# Altium footprint library mylib.PcbLib: 82 footprints (part 4 of 6)
Each footprint in its own frame and in the unit in brackets; x right, y up, seen from the top. Pads: shape width x height; smd on the part's side, far side on the other; paste and mask are expansions set on the pad; w line width, h text height; cw(c..) or ccw(c..) is an arc to the next point about the centre after c.
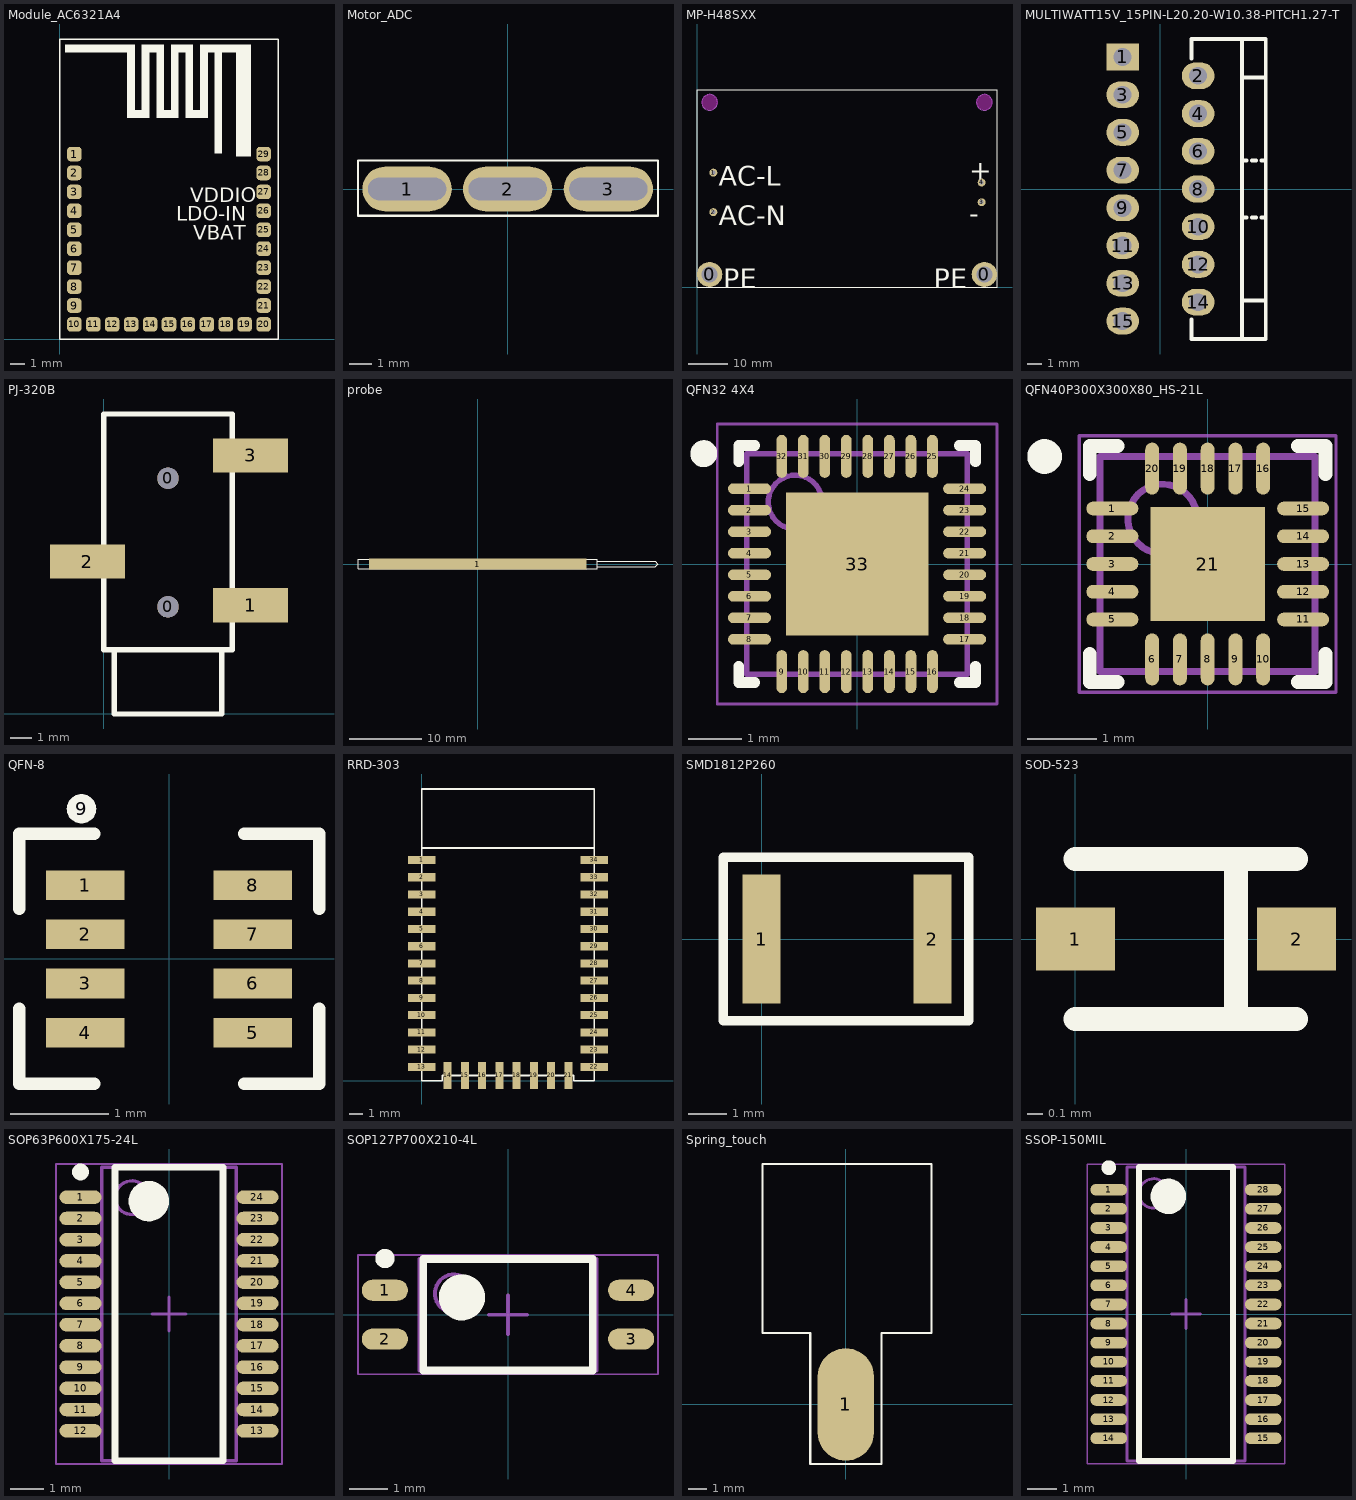
[diagram p3: the footprints below, top view; thin cyan lines are the x and y axes]

## Module_AC6321A4 [mm]
pads (29):
  rrect50% 1x1 smd: 1(1,12.7) 2(1,11.4) 3(1,10.1) 4(1,8.8) 5(1,7.5) 6(1,6.2) 7(1,4.9) 8(1,3.6) 9(1,2.3) 10(1,1) 11(2.3,1) 12(3.6,1) 13(4.9,1) 14(6.2,1) 15(7.5,1) 16(8.8,1) 17(10.1,1) 18(11.4,1) 19(12.7,1) 20(14,1) 21(14,2.3) 22(14,3.6) 23(14,4.9) 24(14,6.2) 25(14,7.5) 26(14,8.8) 27(14,10.1) 28(14,11.4) 29(14,12.7)
Top Overlay:
  region: 6.145,15.7 4.645,15.7 4.645,15.2 6.145,15.2
  region: 9.145,20.2 7.645,20.2 7.645,19.7 9.145,19.7
  region: 5.145,20.2 4.645,20.2 4.645,15.2 5.145,15.2
  region: 5.145,20.2 0.375,20.2 0.375,19.7 5.145,19.7
  region: 13.125,19.95 12.125,19.95 12.125,12.559 13.125,12.559
  region: 11.125,19.95 10.625,19.95 10.625,12.75 11.125,12.75
  region: 10.145,20.2 9.645,20.2 9.645,15.2 10.145,15.2
  region: 13.125,20.2 9.645,20.2 9.645,19.7 13.125,19.7
  region: 9.145,20.2 8.645,20.2 8.645,15.2 9.145,15.2
  region: 10.145,15.7 8.645,15.7 8.645,15.2 10.145,15.2
  region: 6.145,20.2 5.645,20.2 5.645,15.2 6.145,15.2
  region: 8.145,15.7 6.645,15.7 6.645,15.2 8.145,15.2
  region: 8.145,20.2 7.645,20.2 7.645,15.2 8.145,15.2
  region: 7.145,20.2 6.645,20.2 6.645,15.2 7.145,15.2
  region: 7.145,20.2 5.645,20.2 5.645,19.7 7.145,19.7
  lines w0.1: 0,0 15,0 15,20.6 0,20.6 0,0
  text "LDO-IN" at 8,8.113 h1
  text "VDDIO" at 8.952,9.406 h1
  text "VBAT" at 9.152,6.819 h1
3D body: height 1, standoff 0, extent -0.011,0 15,20.625
3D body: height 2, standoff 1, extent 1,1 14,12.7

## Motor_ADC [mm]
pads (3):
  oval 4x2 hole 1 slot 3.5 at 0 deg: 1(-4.5,0) 2(0,0) 3(4.5,0)
Top Overlay:
  lines w0.1: -6.7,-1.2 6.725,-1.2 6.725,1.275 -6.7,1.275 -6.7,-1.2

## MP-H48SXX [mm]
pads (6):
  round 6.4 hole 4: 0(3.2,3.2) 0(72.8,3.2)
  round 2 hole 1: 1(4.15,29) 2(4.15,19) 3(72.1,21.5) 4(72.1,26.5)
Top Overlay:
  lines w0.1: 0,0 76,0 76,50 0,50 0,0
  text "AC-N" at 5.45,15.65 h5
  text "AC-L" at 5.45,25.65 h5
  text "-" at 69,16.125 h5
  text "+" at 68.95,27.125 h5
  text "PE" at 6.65,-0.3 h5
  text "PE" at 60.025,-0.3 h5
Keep-Out Layer:
  board cut-out: 3.2,44.8 3.003,44.8 2.617,44.877 2.253,45.028 1.925,45.246 1.646,45.525 1.428,45.853 1.277,46.217 1.2,46.603 1.2,46.8 1.2,46.997 1.277,47.383 1.428,47.747 1.646,48.075 1.925,48.354 2.253,48.572 2.617,48.723 3.003,48.8 3.2,48.8 3.397,48.8 3.783,48.723 4.147,48.572 4.475,48.354 4.754,48.075 4.972,47.747 5.123,47.383 5.2,46.997 5.2,46.8 5.2,46.603 5.123,46.217 4.972,45.853 4.754,45.525 4.475,45.246 4.147,45.028 3.783,44.877 3.397,44.8
  board cut-out: 70.8,46.8 70.8,46.603 70.877,46.217 71.028,45.853 71.246,45.525 71.525,45.246 71.853,45.028 72.217,44.877 72.603,44.8 72.8,44.8 72.997,44.8 73.383,44.877 73.747,45.028 74.075,45.246 74.354,45.525 74.572,45.853 74.723,46.217 74.8,46.603 74.8,46.8 74.8,46.997 74.723,47.383 74.572,47.747 74.354,48.075 74.075,48.354 73.747,48.572 73.383,48.723 72.997,48.8 72.8,48.8 72.603,48.8 72.217,48.723 71.853,48.572 71.525,48.354 71.246,48.075 71.028,47.747 70.877,47.383 70.8,46.997
Mechanical 1:
  circle w0.1: c72.8,46.8 r2
  circle w0.1: c3.2,46.8 r2
3D body: height 5, standoff 0, extent 0,43.6 6.4,50
3D body: height 5, standoff 0, extent 69.6,43.625 76,50.025
3D body: height 5, standoff 0, extent 69.6,0 76,6.4
3D body: height 5, standoff 0, extent 0.038,0 6.438,6.4
3D body: height 5, standoff 0, extent 71.138,20.5 73.138,22.5
3D body: height 5, standoff 0, extent 71.138,25.5 73.138,27.5
3D body: height 5, standoff 0, extent 3.187,18 5.188,20
3D body: height 5, standoff 0, extent 3.187,28 5.188,30
3D body: height 13.3, standoff 5, extent 0,0 76,50

## MULTIWATT15V_15PIN-L20.20-W10.38-PITCH1.27-T [mm]
pads (15):
  rect 2.2x1.8 hole 1.2: 1(-2.54,8.89)
  oval 2.2x1.8 hole 1.2: 2(2.54,7.62) 3(-2.54,6.35) 4(2.54,5.08) 5(-2.54,3.81) 6(2.54,2.54) 7(-2.54,1.27) 8(2.54,0) 9(-2.54,-1.27) 10(2.54,-2.54) 11(-2.54,-3.81) 12(2.54,-5.08) 13(-2.54,-6.35) 14(2.54,-7.62) 15(-2.54,-8.89)
Top Overlay:
  lines w0.254: 2.09,-8.786 2.09,-10.1 7.09,-10.1 7.09,10.1 2.09,10.1 2.09,8.786 ; 5.49,-10.1 5.49,10.1 ; 5.49,-7.5 7.09,-7.5 ; 5.49,-1.925 5.79,-1.925 ; 5.49,1.925 5.79,1.925 ; 5.49,7.5 7.09,7.5 ; 6.15,-1.925 6.45,-1.925 ; 6.15,1.925 6.45,1.925 ; 6.79,-1.925 7.09,-1.925 ; 6.79,1.925 7.09,1.925

## PJ-320B [mm]
pads (5):
  round 1 hole 1: 0(3,5) 0(3,11)
  rect 3.5x1.6 smd: 1(6.858,5.08) 2(-0.762,7.112) 3(6.858,12.065)
Top Overlay:
  lines w0.254: 0.5,2.992 0.5,0 5.5,0 5.5,2.961 ; 0,3 0,14 6,14 6,3 0,3

## probe [mm] "探针"
pads (1):
  rect 30x1.524 smd: 1(0,0)
Top Overlay:
  lines w0.152: 16.51,-0.381 24.51,-0.381 ; 16.51,0.381 24.51,0.381 ; 24.511,-0.381 24.892,0 24.511,0.381 ; -16.51,-0.635 -16.51,0.635 16.49,0.635 16.49,-0.635 -16.51,-0.635

## QFN32 4X4 [mm] "JieLi 32-bit MCU, QFN32"
pads (33):
  oval 0.8x0.2 smd mask+0.05: 1(-2,1.4) 2(-2,1) 3(-2,0.6) 4(-2,0.2) 5(-2,-0.2) 6(-2,-0.6) 7(-2,-1) 8(-2,-1.4) 17(2,-1.4) 18(2,-1) 19(2,-0.6) 20(2,-0.2) 21(2,0.2) 22(2,0.6) 23(2,1) 24(2,1.4)
  oval 0.2x0.8 smd mask+0.05: 9(-1.4,-2) 10(-1,-2) 11(-0.6,-2) 12(-0.2,-2) 13(0.2,-2) 14(0.6,-2) 15(1,-2) 16(1.4,-2) 25(1.4,2) 26(1,2) 27(0.6,2) 28(0.2,2) 29(-0.2,2) 30(-0.6,2) 31(-1,2) 32(-1.4,2)
  rect 2.65x2.65 smd mask+0.05: 33(0,0)
Top Overlay:
  circle w0.25: c-2.85,2.05 r0.125
  lines w0.2: -2.2,-1.9 -2.2,-2.2 -1.9,-2.2 ; -2.2,1.9 -2.2,2.2 -1.9,2.2 ; 1.9,-2.2 2.2,-2.2 2.2,-1.9 ; 1.9,2.2 2.2,2.2 2.2,1.9
Mechanical 13:
  circle w0.1: c-1.15,1.15 r0.5
  lines w0.1: -2.05,-2.05 2.05,-2.05 2.05,2.05 -2.05,2.05 -2.05,-2.05
Mechanical 15:
  lines w0.05: -2.6,-2.6 2.6,-2.6 2.6,2.6 -2.6,2.6 -2.6,-2.6
3D body "QFN40P400X400X80_HS-33N.step": height 0.8, standoff 0, extent -2.051,-2.051 2.051,2.051

## QFN40P300X300X80_HS-21L [mm] "QFN, 20-Leads, Body 3.00x3.00mm, Pitch 0.40mm, Thermal Pad 1.65x1.65mm, IPC High Density"
height 0.8
pads (21):
  oval 0.75x0.2 smd: 1(-1.375,0.8) 2(-1.375,0.4) 3(-1.375,0) 4(-1.375,-0.4) 5(-1.375,-0.8) 11(1.375,-0.8) 12(1.375,-0.4) 13(1.375,0) 14(1.375,0.4) 15(1.375,0.8)
  oval 0.2x0.75 smd: 6(-0.8,-1.375) 7(-0.4,-1.375) 8(0,-1.375) 9(0.4,-1.375) 10(0.8,-1.375) 16(0.8,1.375) 17(0.4,1.375) 18(0,1.375) 19(-0.4,1.375) 20(-0.8,1.375)
  rect 1.65x1.65 smd: 21(0,0)
Top Overlay:
  circle w0.25: c-2.35,1.55 r0.125
  lines w0.2: -1.7,-1.3 -1.7,-1.7 -1.3,-1.7 ; -1.7,1.3 -1.7,1.7 -1.3,1.7 ; 1.3,-1.7 1.7,-1.7 1.7,-1.3 ; 1.3,1.7 1.7,1.7 1.7,1.3
Mechanical 13:
  circle w0.1: c-0.65,0.65 r0.5
  lines w0.1: -1.55,-1.55 -1.55,1.55 1.55,1.55 1.55,-1.55 -1.55,-1.55
Mechanical 15:
  lines w0.05: -1.85,-1.85 -1.85,1.85 1.85,1.85 1.85,-1.85 -1.85,-1.85
  lines w0.1: -0.5,0 0.5,0 ; 0,-0.5 0,0.5
3D body: height 0.8, standoff 0, extent -1.55,-1.55 1.55,1.55

## QFN-8 [mm]
pads (9):
  rect 0.8x0.3 smd: 1(-0.85,0.75) 2(-0.85,0.25) 3(-0.85,-0.25) 4(-0.85,-0.75) 5(0.85,-0.75) 6(0.85,-0.25) 7(0.85,0.25) 8(0.85,0.75)
  round 0.3 on Top Overlay: 9(-0.889,1.524)
Top Overlay:
  lines w0.127: -1.524,-0.508 -1.524,-1.27 -0.762,-1.27 ; -1.524,0.508 -1.524,1.27 -0.762,1.27 ; 0.762,-1.27 1.524,-1.27 1.524,-0.508 ; 0.762,1.27 1.524,1.27 1.524,0.508
3D body: height 1, standoff 0, extent -0.762,-1.27 0.762,1.27

## RRD-303 [mm]
pads (34):
  rect 2x0.6 smd: 1(0,16.27) 2(0,15) 3(0,13.73) 4(0,12.46) 5(0,11.19) 6(0,9.92) 7(0,8.65) 8(0,7.38) 9(0,6.11) 10(0,4.84) 11(0,3.57) 12(0,2.3) 13(0,1.03) 22(12.7,1.03) 23(12.7,2.3) 24(12.7,3.57) 25(12.7,4.84) 26(12.7,6.11) 27(12.7,7.38) 28(12.7,8.65) 29(12.7,9.92) 30(12.7,11.19) 31(12.7,12.46) 32(12.7,13.73) 33(12.7,15) 34(12.7,16.27)
  rect 0.6x2 smd: 14(1.905,0.4) 15(3.175,0.4) 16(4.445,0.4) 17(5.715,0.4) 18(6.985,0.4) 19(8.255,0.4) 20(9.525,0.4) 21(10.795,0.4)
Top Overlay:
  lines w0.127: 0,17.159 12.7,17.159 ; 0,0 0,21.5 12.7,21.5 12.7,0 11.2,0 11.2,0.4 1.5,0.4 1.5,0 0,0
3D body: height 1, standoff 0, extent 0,0 12.7,21.463

## SMD1812P260 [mm]
pads (2):
  rect 1x3.41 smd: 1(0,0) 2(4.5,0)
Top Overlay:
  lines w0.254: -1.016,-2.159 -1.016,2.159 5.461,2.159 5.461,-2.159 -1.016,-2.159

## SOD-523 [mm]
height 0.6
pads (2):
  rect 0.5x0.4 smd: 1(0,0) 2(1.4,0)
Top Overlay:
  lines w0.152: 0,-0.508 1.397,-0.508 ; 0,0.508 1.397,0.508 ; 1.016,-0.508 1.016,0.508

## SOP63P600X175-24L [mm] "SOP, 24-Leads, Body 8.65x3.90mm, Pitch 0.63mm, IPC High Density"
height 1.75
pads (24):
  oval 1.25x0.4 smd: 1(-2.625,3.465) 2(-2.625,2.835) 3(-2.625,2.205) 4(-2.625,1.575) 5(-2.625,0.945) 6(-2.625,0.315) 7(-2.625,-0.315) 8(-2.625,-0.945) 9(-2.625,-1.575) 10(-2.625,-2.205) 11(-2.625,-2.835) 12(-2.625,-3.465) 13(2.625,-3.465) 14(2.625,-2.835) 15(2.625,-2.205) 16(2.625,-1.575) 17(2.625,-0.945) 18(2.625,-0.315) 19(2.625,0.315) 20(2.625,0.945) 21(2.625,1.575) 22(2.625,2.205) 23(2.625,2.835) 24(2.625,3.465)
Top Overlay:
  circle w0.25: c-2.625,4.215 r0.125
  circle w0.6: c-0.6,3.35 r0.3
  lines w0.2: -1.6,-4.35 -1.6,4.35 1.6,4.35 1.6,-4.35 -1.6,-4.35
Mechanical 13:
  circle w0.1: c-1.1,3.45 r0.5
  lines w0.1: -2,-4.35 -2,4.35 2,4.35 2,-4.35 -2,-4.35
Mechanical 15:
  lines w0.05: -3.35,-4.45 -3.35,4.45 3.35,4.45 3.35,-4.45 -3.35,-4.45
  lines w0.1: -0.5,0 0.5,0 ; 0,-0.5 0,0.5
3D body "SOP63P600X175-24L.step": height 1.75, standoff 0, extent -2.98,-4.35 2.98,4.35

## SOP127P700X210-4L [mm] "SOP, 4-Leads, Body 2.70x4.40mm, Pitch 1.27mm, IPC High Density"
height 2.1
pads (4):
  oval 1.2x0.55 smd: 1(-3.2,0.635) 2(-3.2,-0.635) 3(3.2,-0.635) 4(3.2,0.635)
Top Overlay:
  circle w0.25: c-3.2,1.46 r0.125
  circle w0.6: c-1.2,0.45 r0.3
  lines w0.2: -2.2,-1.45 -2.2,1.45 2.2,1.45 2.2,-1.45 -2.2,-1.45
Mechanical 13:
  circle w0.1: c-1.4,0.55 r0.5
  lines w0.1: -2.3,-1.45 -2.3,1.45 2.3,1.45 2.3,-1.45 -2.3,-1.45
Mechanical 15:
  lines w0.05: -3.9,-1.55 -3.9,1.55 3.9,1.55 3.9,-1.55 -3.9,-1.55
  lines w0.1: -0.5,0 0.5,0 ; 0,-0.5 0,0.5
3D body "SOP127P700X210-4L.step": height 2.1, standoff 0, extent -3.5,-1.45 3.5,1.45

## Spring_touch [mm]
pads (1):
  oval 3x6 smd: 1(0,0)
Top Overlay:
  lines w0.127: -4.445,12.81 -4.445,3.81 -1.905,3.81 -1.905,-3.175 1.905,-3.175 1.905,3.81 4.572,3.81 4.572,12.827 -4.445,12.827

## SSOP-150MIL [mm] "SOP, 28-Leads, Body 9.90x3.90mm, Pitch 0.65mm, IPC High Density"
height 1.75
pads (28):
  oval 1.25x0.4 smd: 1(-2.625,4.225) 2(-2.625,3.575) 3(-2.625,2.925) 4(-2.625,2.275) 5(-2.625,1.625) 6(-2.625,0.975) 7(-2.625,0.325) 8(-2.625,-0.325) 9(-2.625,-0.975) 10(-2.625,-1.625) 11(-2.625,-2.275) 12(-2.625,-2.925) 13(-2.625,-3.575) 14(-2.625,-4.225) 15(2.625,-4.225) 16(2.625,-3.575) 17(2.625,-2.925) 18(2.625,-2.275) 19(2.625,-1.625) 20(2.625,-0.975) 21(2.625,-0.325) 22(2.625,0.325) 23(2.625,0.975) 24(2.625,1.625) 25(2.625,2.275) 26(2.625,2.925) 27(2.625,3.575) 28(2.625,4.225)
Top Overlay:
  circle w0.25: c-2.625,4.975 r0.125
  circle w0.6: c-0.6,4 r0.3
  lines w0.2: -1.6,-5 -1.6,5 1.6,5 1.6,-5 -1.6,-5
Mechanical 13:
  circle w0.1: c-1.1,4.1 r0.5
  lines w0.1: -2,-5 -2,5 2,5 2,-5 -2,-5
Mechanical 15:
  lines w0.05: -3.35,-5.1 -3.35,5.1 3.35,5.1 3.35,-5.1 -3.35,-5.1
  lines w0.1: -0.5,0 0.5,0 ; 0,-0.5 0,0.5
3D body "SOP65P600X175-28L.step": height 1.75, standoff 0, extent -3,-5 3,5